# Altium footprint library IC.PcbLib: 108 footprints (part 7 of 8)
Each footprint in its own frame and in the unit in brackets; x right, y up, seen from the top. Pads: shape width x height; smd on the part's side, far side on the other; paste and mask are expansions set on the pad; w line width, h text height; cw(c..) or ccw(c..) is an arc to the next point about the centre after c.
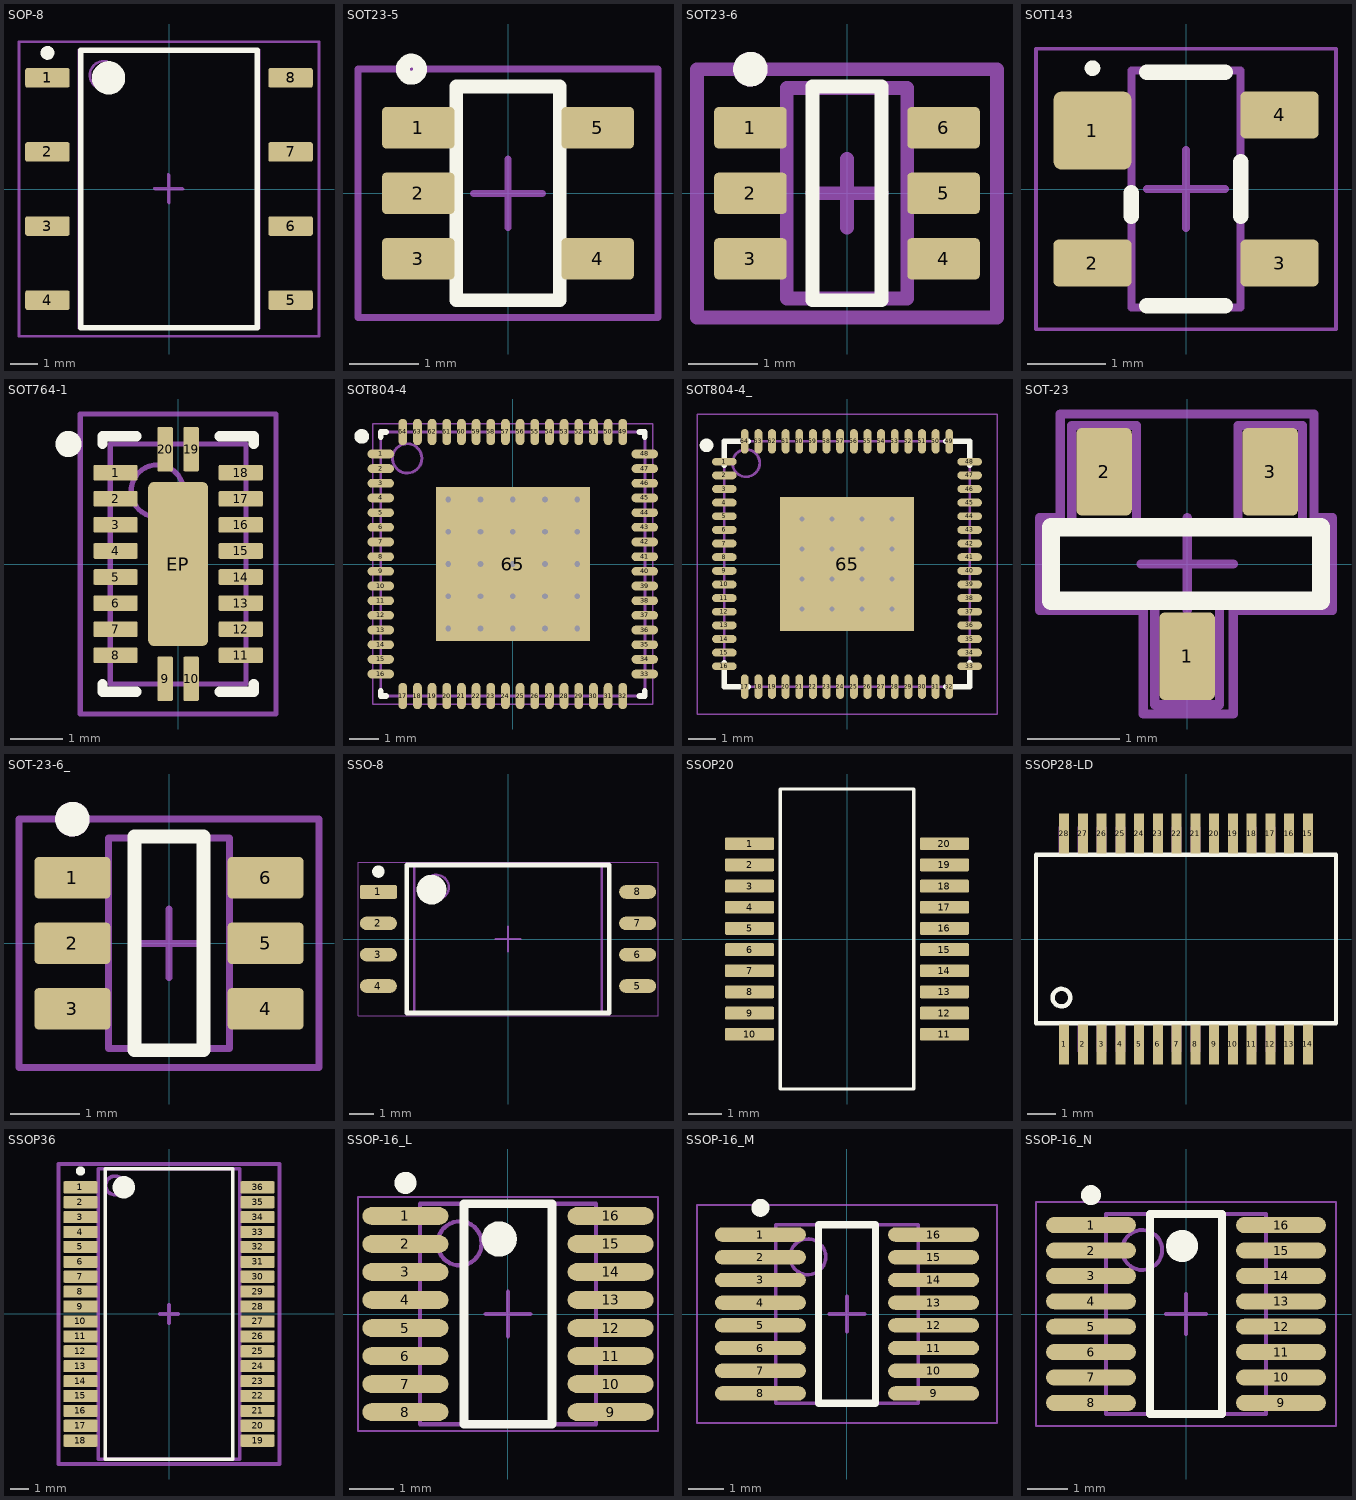
[diagram p6: the footprints below, top view; thin cyan lines are the x and y axes]

## SOP-8 [mm] "LAA127P, SOP, 8-Leads, Body 9,84x6,41mm, Pitch 2,67mm, IPC Medium Density"
height 2.29
pads (8):
  rrect20% 1.6x0.7 smd: 1(-4.375,4) 2(-4.375,1.333) 3(-4.375,-1.333) 4(-4.375,-4) 5(4.375,-4) 6(4.375,-1.333) 7(4.375,1.333) 8(4.375,4)
Top Overlay:
  circle w0.25: c-4.375,4.901 r0.125
  circle w0.6: c-2.175,4 r0.3
  lines w0.2: -3.175,-5 -3.175,5 3.175,5 3.175,-5 -3.175,-5
M3_comm_top:
  text ".comment" at -3.025,-0.475 h2
M5_asm_top:
  circle w0.1: c-2.35,4.1 r0.5
  lines w0.1: -3.25,-5 -3.25,5 3.25,5 3.25,-5 -3.25,-5
  text ".Designator" at -2.875,2.95 h2
M7_courtyard_top:
  lines w0.1: -0.525,0.025 0.475,0.025 ; -0.5,0 0.5,0 ; -0.025,-0.475 -0.025,0.525 ; 0,-0.5 0,0.5 ; -5.4,-5.3 -5.4,5.3 5.4,5.3 5.4,-5.3 -5.4,-5.3
3D body "SOP-8.step": height 2.29, standoff 0, extent -4.731,-5 4.731,5

## SOT23-5 [mm] "AP2210K-5.0TRG1, AP2210K-3.3TRG1, AD8515,  SOT23, 6-Leads, IPC Medium Density"
height 1.45
pads (5):
  rrect20% 1.05x0.6 smd mask+0.05: 1(-1.3,0.95) 2(-1.3,0) 3(-1.3,-0.95) 4(1.3,-0.95) 5(1.3,0.95)
Top Overlay:
  circle w0.2: c-1.4,1.8 r0.125
  lines w0.2: -0.75,-1.55 0.75,-1.55 0.75,1.55 -0.75,1.55 -0.75,-1.55
M3_comm_top:
  text ".comment" at 0,0 h1
M5_asm_top:
  circle w0.15: c-1.4,1.8 r0.125
  lines w0.1: -0.75,-1.55 -0.75,1.55 0.75,1.55 0.75,-1.55 -0.75,-1.55
  text ".Designator" at -0.75,1.8 h1
M7_courtyard_top:
  lines w0.1: -0.5,0 0.5,0 ; 0,-0.5 0,0.5 ; -2.175,-1.8 2.175,-1.8 2.175,1.8 -2.175,1.8 -2.175,-1.8
3D body "User Library-SOT23-5.STEP": height 1.12, standoff 0.02, extent -1.4,-1.45 1.4,1.45

## SOT23-6 [mm] "SOT23, 6-Leads, IPC Medium Density"
height 1.45
pads (6):
  rrect20% 1.05x0.6 smd mask+0.05: 1(-1.4,0.95) 2(-1.4,0) 3(-1.4,-0.95) 4(1.4,-0.95) 5(1.4,0) 6(1.4,0.95)
Top Overlay:
  circle w0.25: c-1.4,1.8 r0.125
  lines w0.2: -0.5,-1.55 0.5,-1.55 0.5,1.55 -0.5,1.55 -0.5,-1.55
M3_comm_top:
  text ".comment" at -1.2,-0.5 h2
M5_asm_top:
  circle w0.25: c-1.4,1.8 r0.125
  lines w0.2: -0.875,-1.525 -0.875,1.525 0.875,1.525 0.875,-1.525 -0.875,-1.525
  text ".Designator" at -2.275,2.325 h2
M7_courtyard_top:
  lines w0.2: -0.5,0 0.5,0 ; 0,-0.5 0,0.5 ; -2.175,-1.8 -2.175,1.8 2.175,1.8 2.175,-1.8 -2.175,-1.8
3D body "SOT-23-6-3.step": height 0.86, standoff 0, extent -1.405,-1.5 1.405,1.5

## SOT143 [mm] "SOT143,  IPC Medium Density"
height 1.2
pads (4):
  rrect20% 1x1 smd: 1(-1.2,0.75)
  rrect20% 1x0.6 smd: 2(-1.2,-0.95) 3(1.2,-0.95) 4(1.2,0.95)
Top Overlay:
  circle w0.1: c-1.2,1.55 r0.05
  lines w0.2: -0.7,-0.35 -0.7,-0.05 ; -0.5,-1.5 0.5,-1.5 ; -0.5,1.5 0.5,1.5 ; 0.7,-0.35 0.7,0.35
Mechanical 13:
  lines w0.1: -0.7,-1.52 -0.7,1.52 0.7,1.52 0.7,-1.52 -0.7,-1.52
Mechanical 15:
  lines w0.05: -1.925,-1.8 -1.925,1.8 1.925,1.8 1.925,-1.8 -1.925,-1.8
  lines w0.1: -0.5,0 0.5,0 ; 0,-0.5 0,0.5
3D body "SOT-143.step": height 1, standoff 0, extent -1.21,-1.46 1.21,1.46

## SOT764-1 [mm] "74AHC573BQ,115, DHVQFN20, QFN, 20-Leads, Body 2,60x4,60mm, Pitch 0,50mm, Thermal Pad 1,15x3,15mm, IPC Medium Density"
height 1
pads (21):
  rrect20% 0.85x0.3 smd: 1(-1.2,1.75) 2(-1.2,1.25) 3(-1.2,0.75) 4(-1.2,0.25) 5(-1.2,-0.25) 6(-1.2,-0.75) 7(-1.2,-1.25) 8(-1.2,-1.75) 11(1.2,-1.75) 12(1.2,-1.25) 13(1.2,-0.75) 14(1.2,-0.25) 15(1.2,0.25) 16(1.2,0.75) 17(1.2,1.25) 18(1.2,1.75)
  rrect20% 0.3x0.85 smd: 9(-0.25,-2.2) 10(0.25,-2.2) 19(0.25,2.2) 20(-0.25,2.2)
  rrect20% 1.15x3.15 smd: EP(0,0)
Top Overlay:
  circle w0.25: c-2.1,2.3 r0.125
  lines w0.2: -1.45,-2.3 -1.45,-2.45 -0.8,-2.45 ; -1.45,2.3 -1.45,2.45 -0.8,2.45 ; 0.8,-2.45 1.45,-2.45 1.45,-2.3 ; 0.8,2.45 1.45,2.45 1.45,2.3
M3_comm_top:
  text ".comment" at -2.3,-0.5 h2
M5_asm_top:
  circle w0.1: c-0.4,1.4 r0.5
  lines w0.1: -1.3,-2.3 1.3,-2.3 1.3,2.3 -1.3,2.3 -1.3,-2.3
  text ".Designator" at -3,2.875 h2
M7_courtyard_top:
  lines w0.1: -1.875,-2.875 1.875,-2.875 1.875,2.875 -1.875,2.875 -1.875,-2.875 ; -0.5,0 0.5,0 -0.5,0 ; 0,-0.5 0,0.5 0,-0.5
3D body "SOT764-1.step": height 1, standoff 0, extent -1.301,-2.301 1.301,2.301

## SOT804-4 [mm] "PQFN, 64-Leads, Body 9.00x9.00mm, Pitch 0.50mm, Thermal Pad 5.25x5.25mm, IPC Medium Density"
height 1
pads (65):
  oval 0.9x0.3 smd: 1(-4.5,3.75) 2(-4.5,3.25) 3(-4.5,2.75) 4(-4.5,2.25) 5(-4.5,1.75) 6(-4.5,1.25) 7(-4.5,0.75) 8(-4.5,0.25) 9(-4.5,-0.25) 10(-4.5,-0.75) 11(-4.5,-1.25) 12(-4.5,-1.75) 13(-4.5,-2.25) 14(-4.5,-2.75) 15(-4.5,-3.25) 16(-4.5,-3.75) 33(4.5,-3.75) 34(4.5,-3.25) 35(4.5,-2.75) 36(4.5,-2.25) 37(4.5,-1.75) 38(4.5,-1.25) 39(4.5,-0.75) 40(4.5,-0.25) 41(4.5,0.25) 42(4.5,0.75) 43(4.5,1.25) 44(4.5,1.75) 45(4.5,2.25) 46(4.5,2.75) 47(4.5,3.25) 48(4.5,3.75)
  oval 0.3x0.9 smd: 17(-3.75,-4.5) 18(-3.25,-4.5) 19(-2.75,-4.5) 20(-2.25,-4.5) 21(-1.75,-4.5) 22(-1.25,-4.5) 23(-0.75,-4.5) 24(-0.25,-4.5) 25(0.25,-4.5) 26(0.75,-4.5) 27(1.25,-4.5) 28(1.75,-4.5) 29(2.25,-4.5) 30(2.75,-4.5) 31(3.25,-4.5) 32(3.75,-4.5) 49(3.75,4.5) 50(3.25,4.5) 51(2.75,4.5) 52(2.25,4.5) 53(1.75,4.5) 54(1.25,4.5) 55(0.75,4.5) 56(0.25,4.5) 57(-0.25,4.5) 58(-0.75,4.5) 59(-1.25,4.5) 60(-1.75,4.5) 61(-2.25,4.5) 62(-2.75,4.5) 63(-3.25,4.5) 64(-3.75,4.5)
  rect 5.25x5.25 smd: 65(0,0)
via -2.2,2.2 diameter 0.5 hole 0.2
via -1.1,2.2 diameter 0.5 hole 0.2
via 0,2.2 diameter 0.5 hole 0.2
via 1.1,2.2 diameter 0.5 hole 0.2
via 2.2,2.2 diameter 0.5 hole 0.2
via -2.2,1.1 diameter 0.5 hole 0.2
via -1.1,1.1 diameter 0.5 hole 0.2
via 0,1.1 diameter 0.5 hole 0.2
via 1.1,1.1 diameter 0.5 hole 0.2
via 2.2,1.1 diameter 0.5 hole 0.2
via -2.2,0 diameter 0.5 hole 0.2
via -1.1,0 diameter 0.5 hole 0.2
via 0,0 diameter 0.5 hole 0.2
via 1.1,0 diameter 0.5 hole 0.2
via 2.2,0 diameter 0.5 hole 0.2
via -2.2,-1.1 diameter 0.5 hole 0.2
via -1.1,-1.1 diameter 0.5 hole 0.2
via 0,-1.1 diameter 0.5 hole 0.2
via 1.1,-1.1 diameter 0.5 hole 0.2
via 2.2,-1.1 diameter 0.5 hole 0.2
via -2.2,-2.2 diameter 0.5 hole 0.2
via -1.1,-2.2 diameter 0.5 hole 0.2
via 0,-2.2 diameter 0.5 hole 0.2
via 1.1,-2.2 diameter 0.5 hole 0.2
via 2.2,-2.2 diameter 0.5 hole 0.2
Top Overlay:
  circle w0.25: c-5.15,4.35 r0.125
  lines w0.2: -4.5,-4.325 -4.5,-4.5 -4.325,-4.5 ; -4.5,4.325 -4.5,4.5 -4.325,4.5 ; 4.325,-4.5 4.5,-4.5 4.5,-4.325 ; 4.325,4.5 4.5,4.5 4.5,4.325
Mechanical 13:
  circle w0.1: c-3.6,3.6 r0.5
  lines w0.1: -4.5,-4.5 -4.5,4.5 4.5,4.5 4.5,-4.5 -4.5,-4.5
Mechanical 15:
  lines w0.05: -4.775,-4.775 -4.775,4.775 4.775,4.775 4.775,-4.775 -4.775,-4.775
  lines w0.1: -0.5,0 0.5,0 ; 0,-0.5 0,0.5
3D body "SOT804-4.step": height 1, standoff 0, extent -4.5,-4.5 4.5,4.5

## SOT804-4_ [mm] "QFN, 32-Leads, Body 7x7mm, Pitch 0.65mm, Thermal Pad 4.9x4.9mm, IPC Low Density"
height 1
pads (65):
  oval 0.9x0.29 smd: 1(-4.5,3.75) 2(-4.5,3.25) 3(-4.5,2.75) 4(-4.5,2.25) 5(-4.5,1.75) 6(-4.5,1.25) 7(-4.5,0.75) 8(-4.5,0.25) 9(-4.5,-0.25) 10(-4.5,-0.75) 11(-4.5,-1.25) 12(-4.5,-1.75) 13(-4.5,-2.25) 14(-4.5,-2.75) 15(-4.5,-3.25) 16(-4.5,-3.75) 33(4.5,-3.75) 34(4.5,-3.25) 35(4.5,-2.75) 36(4.5,-2.25) 37(4.5,-1.75) 38(4.5,-1.25) 39(4.5,-0.75) 40(4.5,-0.25) 41(4.5,0.25) 42(4.5,0.75) 43(4.5,1.25) 44(4.5,1.75) 45(4.5,2.25) 46(4.5,2.75) 47(4.5,3.25) 48(4.5,3.75)
  oval 0.29x0.9 smd: 17(-3.75,-4.5) 18(-3.25,-4.5) 19(-2.75,-4.5) 20(-2.25,-4.5) 21(-1.75,-4.5) 22(-1.25,-4.5) 23(-0.75,-4.5) 24(-0.25,-4.5) 25(0.25,-4.5) 26(0.75,-4.5) 27(1.25,-4.5) 28(1.75,-4.5) 29(2.25,-4.5) 30(2.75,-4.5) 31(3.25,-4.5) 32(3.75,-4.5) 49(3.75,4.5) 50(3.25,4.5) 51(2.75,4.5) 52(2.25,4.5) 53(1.75,4.5) 54(1.25,4.5) 55(0.75,4.5) 56(0.25,4.5) 57(-0.25,4.5) 58(-0.75,4.5) 59(-1.25,4.5) 60(-1.75,4.5) 61(-2.25,4.5) 62(-2.75,4.5) 63(-3.25,4.5) 64(-3.75,4.5)
  rect 4.9x4.9 smd: 65(0,0)
via -1.65,1.65 diameter 0.5 hole 0.2
via -0.55,1.65 diameter 0.5 hole 0.2
via 0.55,1.65 diameter 0.5 hole 0.2
via 1.65,1.65 diameter 0.5 hole 0.2
via -1.65,0.55 diameter 0.5 hole 0.2
via -0.55,0.55 diameter 0.5 hole 0.2
via 0.55,0.55 diameter 0.5 hole 0.2
via 1.65,0.55 diameter 0.5 hole 0.2
via -1.65,-0.55 diameter 0.5 hole 0.2
via -0.55,-0.55 diameter 0.5 hole 0.2
via 0.55,-0.55 diameter 0.5 hole 0.2
via 1.65,-0.55 diameter 0.5 hole 0.2
via -1.65,-1.65 diameter 0.5 hole 0.2
via -0.55,-1.65 diameter 0.5 hole 0.2
via 0.55,-1.65 diameter 0.5 hole 0.2
via 1.65,-1.65 diameter 0.5 hole 0.2
Top Overlay:
  circle w0.25: c-5.15,4.35 r0.125
  lines w0.2: -4.5,-3.625 -4.5,-4.5 -3.625,-4.5 ; -4.5,3.625 -4.5,4.5 -3.625,4.5 ; 3.625,-4.5 4.5,-4.5 4.5,-3.625 ; 3.625,4.5 4.5,4.5 4.5,3.625
Mechanical 13:
  circle w0.1: c-3.7,3.7 r0.5
  lines w0.1: -4.5,-4.5 -4.5,4.5 4.5,4.5 4.5,-4.5 -4.5,-4.5
Mechanical 15:
  lines w0.05: -5.5,-5.5 -5.5,5.5 5.5,5.5 5.5,-5.5 -5.5,-5.5
  lines w0.1: -0.5,0 0.5,0 ; 0,-0.5 0,0.5
3D body: height 1, standoff 0, extent -4.5,-4.5 4.5,4.5

## SOT-23 [mm] "SENSOR HALL EFFECT ANALOG SOT23"
height 1.1
pads (3):
  rrect20% 0.6x0.95 smd mask+0.05: 1(0,-1) 2(-0.9,1) 3(0.9,1)
Top Overlay:
  lines w0.2: -1.475,-0.4 1.45,-0.4 1.45,0.4 -1.475,0.4 -1.475,-0.4
M3_comm_top:
  text ".comment" at -1.7,-0.4 h1
M5_asm_top:
  lines w0.1: -1.25,0.4 -1.25,1.5 -0.55,1.5 -0.55,0.4 ; -0.35,-0.4 -0.35,-1.525 0.35,-1.525 0.35,-0.4 ; 0.55,0.4 0.55,0.8 0.55,1.5 1.25,1.5 1.25,0.4 ; -1.475,-0.4 1.45,-0.4 1.45,0.4 -1.475,0.4 -1.475,-0.4
  text ".Designator" at -1.425,1.7 h1
M7_courtyard_top:
  lines w0.1: -0.5,0 0.5,0 ; 0,-0.5 0,0.5 ; -1.6,-0.5 -0.475,-0.5 -0.475,-1.625 -0.1,-1.625 0.5,-1.625 0.5,-0.5 1.575,-0.5 1.575,0.5 1.375,0.5 1.375,1.625 -1.375,1.625 -1.375,0.5 -1.6,0.5 -1.6,-0.5
3D body "User Library-sot23-1.STEP": height 1, standoff 0, extent -1.46,-1.17 1.46,1.17

## SOT-23-6_ [mm] "SN74LVC2G14DBVR, SOT23, 6-Leads, IPC Medium Density"
height 1.45
pads (6):
  rrect20% 1.1x0.6 smd mask+0.05: 1(-1.4,0.95) 2(-1.4,0) 3(-1.4,-0.95) 4(1.4,-0.95) 5(1.4,0) 6(1.4,0.95)
Top Overlay:
  circle w0.25: c-1.4,1.8 r0.125
  lines w0.2: -0.5,-1.55 -0.5,1.55 0.5,1.55 0.5,-1.55 -0.5,-1.55
M3_comm_top:
  text ".comment" at -1.2,-0.5 h1
M5_asm_top:
  circle w0.25: c-1.4,1.8 r0.125
  lines w0.1: -0.875,-1.525 0.875,-1.525 0.875,1.525 -0.875,1.525 -0.875,-1.525
  text ".Designator" at -1,2.025 h1
M7_courtyard_top:
  lines w0.1: -0.5,0 0.5,0 ; 0,-0.5 0,0.5 ; -2.175,-1.8 2.175,-1.8 2.175,1.8 -2.175,1.8 -2.175,-1.8
3D body "SOT-23-6-3.step": height 0.86, standoff 0, extent -1.405,-1.5 1.405,1.5

## SSO-8 [mm] "SOIC, WIDE, IPC High Density"
height 2.8
pads (8):
  rrect20% 1.5x0.55 smd: 1(-5.25,1.905)
  oval 1.5x0.55 smd: 2(-5.25,0.635) 3(-5.25,-0.635) 4(-5.25,-1.905) 5(5.25,-1.905) 6(5.25,-0.635) 7(5.25,0.635) 8(5.25,1.905)
Top Overlay:
  circle w0.25: c-5.25,2.73 r0.125
  circle w0.6: c-3.1,2 r0.3
  lines w0.2: -4.1,-3 -4.1,3 4.1,3 4.1,-3 -4.1,-3
Mechanical 13:
  circle w0.1: c-2.9,2.1 r0.5
  lines w0.1: -3.8,-3 -3.8,3 3.8,3 3.8,-3 -3.8,-3
Mechanical 15:
  lines w0.05: -6.075,-3.1 -6.075,3.1 6.075,3.1 6.075,-3.1 -6.075,-3.1
  lines w0.1: -0.5,0 0.5,0 ; 0,-0.5 0,0.5
3D body "SSO-8.step": height 2.8, standoff 0, extent -5.75,-3 5.75,3

## SSOP20 [mil] "TTP-224"
pads (20):
  rrect20% 58x15 smd: 1(-115,112.5) 2(-115,87.5) 3(-115,62.5) 4(-115,37.5) 5(-115,12.5) 6(-115,-12.5) 7(-115,-37.5) 8(-115,-62.5) 9(-115,-87.5) 10(-115,-112.5) 11(115,-112.5) 12(115,-87.5) 13(115,-62.5) 14(115,-37.5) 15(115,-12.5) 16(115,12.5) 17(115,37.5) 18(115,62.5) 19(115,87.5) 20(115,112.5)
Top Overlay:
  lines w3.94: -78.74,-177.17 78.74,-177.17 78.74,177.17 -78.74,177.17 -78.74,-177.17

## SSOP28-LD [mm]
pads (28):
  rect 0.348x1.397 smd: 1(-4.225,-3.656) 2(-3.575,-3.656) 3(-2.925,-3.656) 4(-2.275,-3.656) 5(-1.625,-3.656) 6(-0.975,-3.656) 7(-0.325,-3.656) 8(0.325,-3.656) 9(0.975,-3.656) 10(1.625,-3.656) 11(2.275,-3.656) 12(2.925,-3.656) 13(3.575,-3.656) 14(4.225,-3.656) 15(4.225,3.656) 16(3.575,3.656) 17(2.925,3.656) 18(2.275,3.656) 19(1.625,3.656) 20(0.975,3.656) 21(0.325,3.656) 22(-0.325,3.656) 23(-0.975,3.656) 24(-1.625,3.656) 25(-2.275,3.656) 26(-2.925,3.656) 27(-3.575,3.656) 28(-4.225,3.656)
Top Overlay:
  circle w0.152: c-4.318,-2.032 r0.305
  lines w0.152: -5.2,-2.925 -5.2,2.925 5.2,2.925 5.2,-2.925 -5.2,-2.925
M1_3D_TOP:
  region: 4.073,-2.966 4.387,-2.966 4.387,-3.91 4.073,-3.91
  region: 3.424,-2.966 3.738,-2.966 3.738,-3.913 3.424,-3.913
  region: 2.772,-2.966 3.087,-2.966 3.087,-3.914 2.772,-3.914
  region: 2.118,-2.966 2.438,-2.966 2.438,-3.911 2.118,-3.911
  region: 1.468,-2.966 1.787,-2.966 1.787,-3.915 1.468,-3.915
  region: 0.814,-2.966 1.138,-2.966 1.138,-3.909 0.814,-3.909
  region: 0.163,-2.966 0.487,-2.966 0.487,-3.907 0.163,-3.907
  region: -0.489,-2.966 -0.162,-2.966 -0.162,-3.914 -0.489,-3.914
  region: -1.14,-2.966 -0.813,-2.966 -0.813,-3.909 -1.14,-3.909
  region: -1.791,-2.966 -1.462,-2.966 -1.462,-3.908 -1.791,-3.908
  region: -2.439,-2.966 -2.113,-2.966 -2.113,-3.903 -2.439,-3.903
  region: 4.07,3.9 4.387,3.9 4.387,2.971 4.07,2.971
  region: 3.421,3.9 3.738,3.9 3.738,2.973 3.421,2.973
  region: 2.775,3.9 3.087,3.9 3.087,2.979 2.775,2.979
  region: 2.119,3.9 2.438,3.9 2.438,2.974 2.119,2.974
  region: 1.467,3.9 1.787,3.9 1.787,2.974 1.467,2.974
  region: 0.815,3.9 1.138,3.9 1.138,2.975 0.815,2.975
  region: 0.163,3.9 0.487,3.9 0.487,2.973 0.163,2.973
  region: -0.489,3.9 -0.162,3.9 -0.162,2.972 -0.489,2.972
  region: -1.139,3.9 -0.813,3.9 -0.813,2.97 -1.139,2.97
  region: -1.795,3.9 -1.462,3.9 -1.462,2.977 -1.795,2.977
  region: -2.443,3.9 -2.113,3.9 -2.113,2.973 -2.443,2.973
  region: -3.096,3.9 -2.762,3.9 -2.762,2.974 -3.096,2.974
  region: -3.75,3.9 -3.413,3.9 -3.413,2.975 -3.75,2.975
  region: -3.091,-2.966 -2.762,-2.966 -2.762,-3.905 -3.091,-3.905
  region: -3.751,-2.966 -3.413,-2.966 -3.413,-3.914 -3.751,-3.914
  region: -4.401,-2.966 -4.062,-2.966 -4.062,-3.912 -4.401,-3.912
  region: -4.405,3.9 -4.062,3.9 -4.062,2.977 -4.405,2.977

## SSOP36 [mm] "MAX7300, MAX7301"
height 2.64
pads (36):
  rrect20% 1.85x0.65 smd: 1(-4.75,6.8) 2(-4.75,6) 3(-4.75,5.2) 4(-4.75,4.4) 5(-4.75,3.6) 6(-4.75,2.8) 7(-4.75,2) 8(-4.75,1.2) 9(-4.75,0.4) 10(-4.75,-0.4) 11(-4.75,-1.2) 12(-4.75,-2) 13(-4.75,-2.8) 14(-4.75,-3.6) 15(-4.75,-4.4) 16(-4.75,-5.2) 17(-4.75,-6) 18(-4.75,-6.8) 19(4.75,-6.8) 20(4.75,-6) 21(4.75,-5.2) 22(4.75,-4.4) 23(4.75,-3.6) 24(4.75,-2.8) 25(4.75,-2) 26(4.75,-1.2) 27(4.75,-0.4) 28(4.75,0.4) 29(4.75,1.2) 30(4.75,2) 31(4.75,2.8) 32(4.75,3.6) 33(4.75,4.4) 34(4.75,5.2) 35(4.75,6) 36(4.75,6.8)
Top Overlay:
  circle w0.6: c-2.425,6.8 r0.3
  circle w0.25: c-4.75,7.675 r0.125
  lines w0.2: -3.425,-7.8 3.425,-7.8 3.425,7.8 -3.425,7.8 -3.425,-7.8
M3_comm_top:
  text ".comment" at -3,-0.5 h2
M5_asm_top:
  circle w0.2: c-2.9,6.9 r0.5
  lines w0.2: -3.8,-7.8 3.8,-7.8 3.8,7.8 -3.8,7.8 -3.8,-7.8
  text ".Designator" at -4,8.5 h2
M7_courtyard_top:
  lines w0.2: -0.5,0 0.5,0 ; 0,-0.5 0,0.5 ; -5.925,-8.05 5.925,-8.05 5.925,8.05 -5.925,8.05 -5.925,-8.05
3D body "SSOP36.step": height 2.64, standoff 0, extent -5.25,-7.8 5.25,7.8

## SSOP-16_L [mm] "SOP, 16-Leads, Body 4.9x3.9mm, Pitch 0.635mm, IPC High Density"
height 1.76
pads (16):
  oval 1.95x0.4 smd: 1(-2.325,2.222) 2(-2.325,1.587) 3(-2.325,0.953) 4(-2.325,0.318) 5(-2.325,-0.318) 6(-2.325,-0.953) 7(-2.325,-1.587) 8(-2.325,-2.222) 9(2.325,-2.222) 10(2.325,-1.587) 11(2.325,-0.953) 12(2.325,-0.318) 13(2.325,0.318) 14(2.325,0.953) 15(2.325,1.587) 16(2.325,2.222)
Top Overlay:
  circle w0.25: c-2.325,2.973 r0.125
  circle w0.4: c-0.2,1.7 r0.2
  lines w0.2: -1,-2.5 -1,2.5 1,2.5 1,-2.5 -1,-2.5
Mechanical 13:
  circle w0.1: c-1.095,1.6 r0.5
  lines w0.1: -1.995,-2.5 -1.995,2.5 1.995,2.5 1.995,-2.5 -1.995,-2.5
Mechanical 15:
  lines w0.05: -3.4,-2.65 -3.4,2.65 3.4,2.65 3.4,-2.65 -3.4,-2.65
  lines w0.1: -0.5,0 0.5,0 ; 0,-0.5 0,0.5
3D body: height 1.76, standoff 0.1, extent -1.995,-2.5 1.995,2.5

## SSOP-16_M [mm] "SOP, 16-Leads, Body 4.9x3.9mm, Pitch 0.635mm, IPC Low Density"
height 1.76
pads (16):
  oval 2.55x0.4 smd: 1(-2.425,2.222) 2(-2.425,1.587) 3(-2.425,0.953) 4(-2.425,0.318) 5(-2.425,-0.318) 6(-2.425,-0.953) 7(-2.425,-1.587) 8(-2.425,-2.222) 9(2.425,-2.222) 10(2.425,-1.587) 11(2.425,-0.953) 12(2.425,-0.318) 13(2.425,0.318) 14(2.425,0.953) 15(2.425,1.587) 16(2.425,2.222)
Top Overlay:
  circle w0.25: c-2.425,2.973 r0.125
  lines w0.2: -0.8,-2.5 0.8,-2.5 0.8,2.5 -0.8,2.5 -0.8,-2.5
Mechanical 13:
  circle w0.1: c-1.095,1.6 r0.5
  lines w0.1: -1.995,-2.5 1.995,-2.5 1.995,2.5 -1.995,2.5 -1.995,-2.5
Mechanical 15:
  lines w0.05: -4.2,-3.05 4.2,-3.05 4.2,3.05 -4.2,3.05 -4.2,-3.05
  lines w0.1: -0.5,0 0.5,0 ; 0,-0.5 0,0.5
3D body: height 1.76, standoff 0.1, extent -1.995,-2.5 1.995,2.5

## SSOP-16_N [mm] "SOP, 16-Leads, Body 4.9x3.9mm, Pitch 0.635mm, IPC Medium Density"
height 1.76
pads (16):
  oval 2.25x0.4 smd: 1(-2.375,2.222) 2(-2.375,1.587) 3(-2.375,0.953) 4(-2.375,0.318) 5(-2.375,-0.318) 6(-2.375,-0.953) 7(-2.375,-1.587) 8(-2.375,-2.222) 9(2.375,-2.222) 10(2.375,-1.587) 11(2.375,-0.953) 12(2.375,-0.318) 13(2.375,0.318) 14(2.375,0.953) 15(2.375,1.587) 16(2.375,2.222)
Top Overlay:
  circle w0.25: c-2.375,2.973 r0.125
  circle w0.4: c-0.1,1.7 r0.2
  lines w0.2: -0.9,-2.5 -0.9,2.5 0.9,2.5 0.9,-2.5 -0.9,-2.5
Mechanical 13:
  circle w0.1: c-1.095,1.6 r0.5
  lines w0.1: -1.995,-2.5 -1.995,2.5 1.995,2.5 1.995,-2.5 -1.995,-2.5
Mechanical 15:
  lines w0.05: -3.75,-2.8 -3.75,2.8 3.75,2.8 3.75,-2.8 -3.75,-2.8
  lines w0.1: -0.5,0 0.5,0 ; 0,-0.5 0,0.5
3D body: height 1.76, standoff 0.1, extent -1.995,-2.5 1.995,2.5